# Altium footprint library cool_library.PcbLib: 1182 footprints (part 37 of 75)
Each footprint in its own frame and in the unit in brackets; x right, y up, seen from the top. Pads: shape width x height; smd on the part's side, far side on the other; paste and mask are expansions set on the pad; w line width, h text height; cw(c..) or ccw(c..) is an arc to the next point about the centre after c.
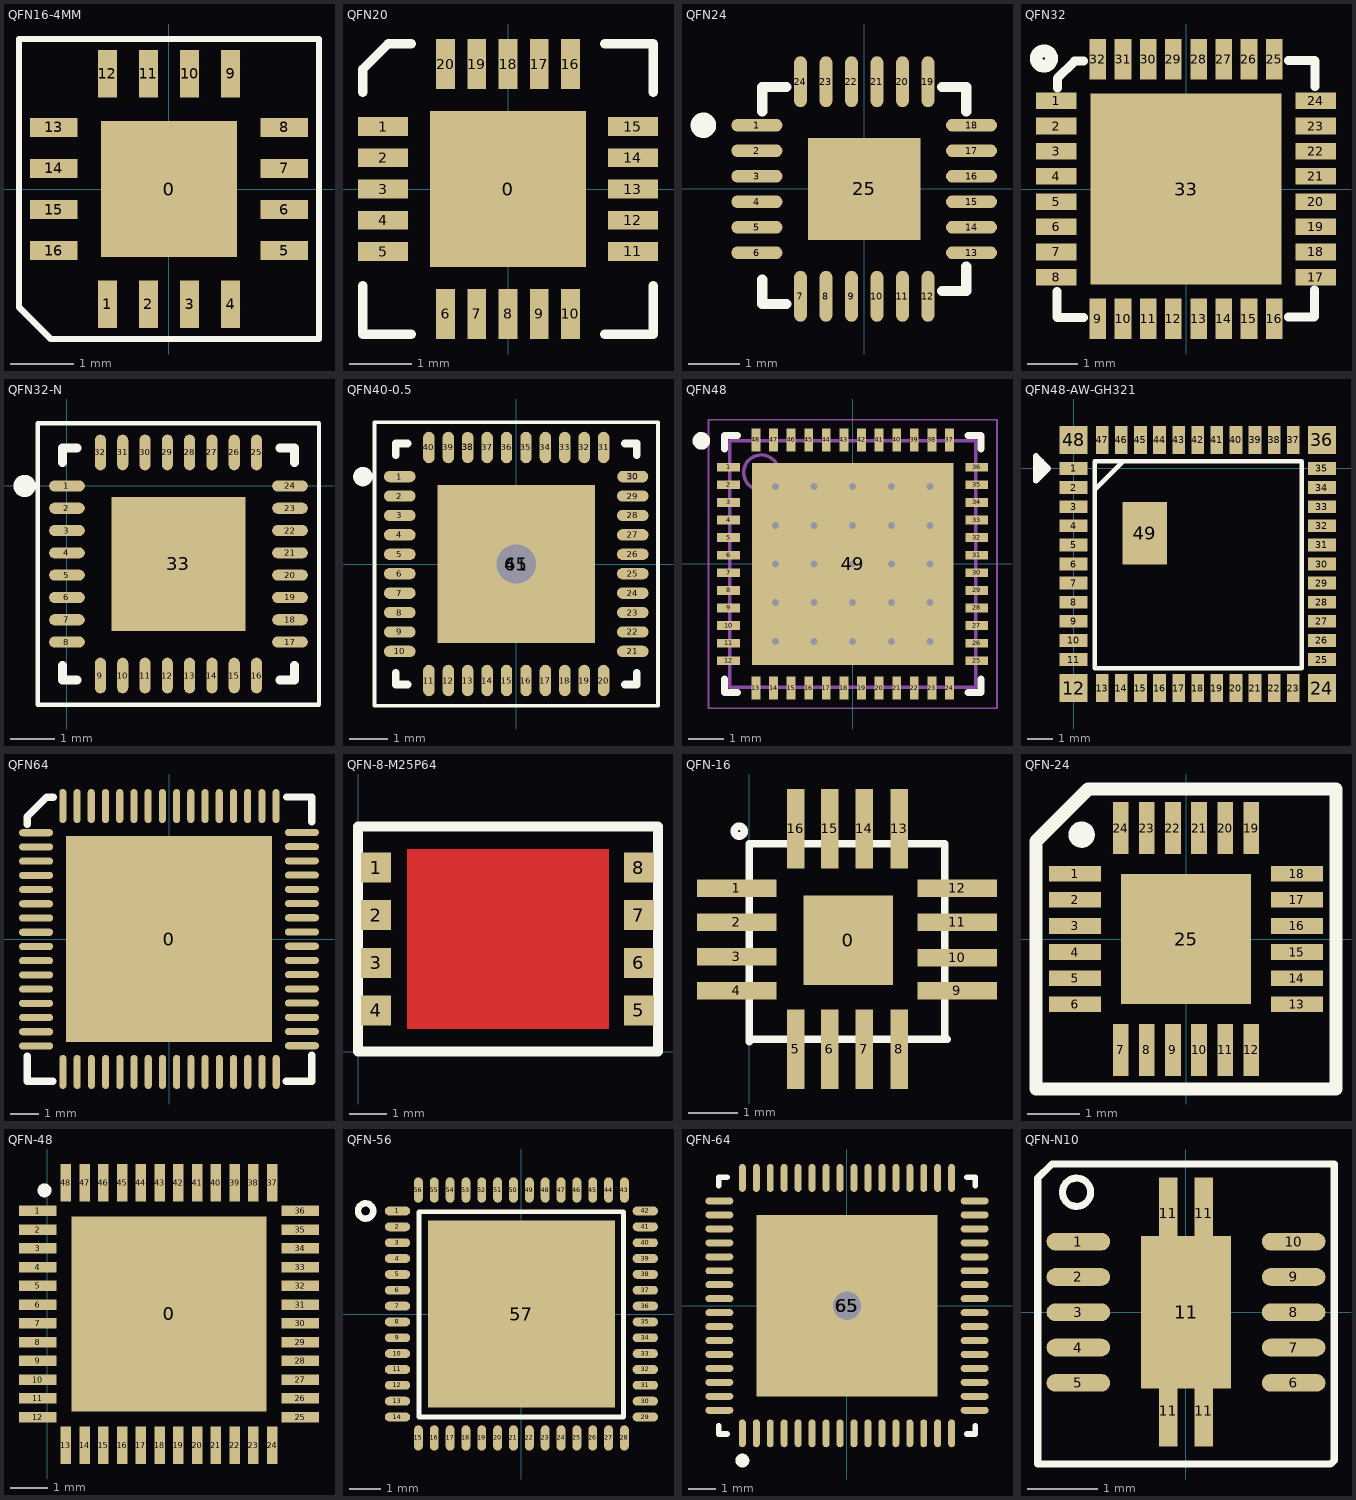
[diagram p36: the footprints below, top view; thin cyan lines are the x and y axes]

## QFN16-4MM [mm] "LNA"
height 5.33
pads (17):
  rect 2.15x2.15 smd: 0(0,0)
  rect 0.3x0.75 smd: 1(-0.975,-1.825) 2(-0.325,-1.825) 3(0.325,-1.825) 4(0.975,-1.825) 9(0.975,1.825) 10(0.325,1.825) 11(-0.325,1.825) 12(-0.975,1.825)
  rect 0.75x0.3 smd: 5(1.825,-0.975) 6(1.825,-0.325) 7(1.825,0.325) 8(1.825,0.975) 13(-1.825,0.975) 14(-1.825,0.325) 15(-1.825,-0.325) 16(-1.825,-0.975)
Top Overlay:
  lines w0.1: -1.025,2.375 2.375,2.375 2.375,-2.375 -1.525,-2.375 -1.875,-2.375 -2.375,-1.875 -2.375,-1.425 -2.375,2.375 -0.4,2.375
3D body: height 0.85, standoff 0, extent -2.001,-1.981 2.001,2.021

## QFN20 [mm]
pads (21):
  rect 2.5x2.5 smd: 0(0,0)
  rect 0.8x0.3 smd: 1(-2,1) 2(-2,0.5) 3(-2,0) 4(-2,-0.5) 5(-2,-1) 11(2,-1) 12(2,-0.5) 13(2,0) 14(2,0.5) 15(2,1)
  rect 0.3x0.8 smd: 6(-1,-2) 7(-0.5,-2) 8(0,-2) 9(0.5,-2) 10(1,-2) 16(1,2) 17(0.5,2) 18(0,2) 19(-0.5,2) 20(-1,2)
Top Overlay:
  lines w0.15: -2.325,-1.55 -2.325,-2.325 -1.55,-2.325 ; -2.325,1.55 -2.325,1.917 -1.917,2.325 -1.55,2.325 ; 1.55,-2.325 2.325,-2.325 2.325,-1.55 ; 1.55,2.325 2.325,2.325 2.325,1.55
3D body: height 0.62, standoff -0.08, extent -1.501,-1.5 1.499,1.5

## QFN24 [mm]
pads (25):
  oval 1x0.25 smd: 1(-2.104,1.25) 2(-2.104,0.75) 3(-2.104,0.25) 4(-2.104,-0.25) 5(-2.104,-0.75) 6(-2.104,-1.25) 13(2.104,-1.25) 14(2.104,-0.75) 15(2.104,-0.25) 16(2.104,0.25) 17(2.104,0.75) 18(2.104,1.25)
  oval 0.25x1 smd: 7(-1.25,-2.104) 8(-0.75,-2.104) 9(-0.25,-2.104) 10(0.25,-2.104) 11(0.75,-2.104) 12(1.25,-2.104) 19(1.25,2.104) 20(0.75,2.104) 21(0.25,2.104) 22(-0.25,2.104) 23(-0.75,2.104) 24(-1.25,2.104)
  rect 2.2x2 smd: 25(0,0)
Top Overlay:
  circle w0.25: c-3.154,1.25 r0.125
  lines w0.2: -2,-1.779 -2,-2.254 -1.525,-2.254 ; -2,1.525 -2,2 -1.525,2 ; 1.525,-2 2,-2 2,-1.525 ; 1.525,2 2,2 2,1.525

## QFN32 [mil]
pads (33):
  rect 31.5x13 smd: 1(-101.5,68.92) 2(-101.5,49.23) 3(-101.5,29.54) 4(-101.5,9.85) 5(-101.5,-9.85) 6(-101.5,-29.54) 7(-101.5,-49.23) 8(-101.5,-68.92) 17(101.5,-68.92) 18(101.5,-49.23) 19(101.5,-29.54) 20(101.5,-9.85) 21(101.5,9.85) 22(101.5,29.54) 23(101.5,49.23) 24(101.5,68.92)
  rect 13x31.5 smd: 9(-68.92,-101.5) 10(-49.23,-101.5) 11(-29.54,-101.5) 12(-9.85,-101.5) 13(9.85,-101.5) 14(29.54,-101.5) 15(49.23,-101.5) 16(68.92,-101.5) 25(68.92,101.5) 26(49.23,101.5) 27(29.54,101.5) 28(9.85,101.5) 29(-9.85,101.5) 30(-29.54,101.5) 31(-49.23,101.5) 32(-68.92,101.5)
  rect 149.61x149.61 smd: 33(0,0)
Top Overlay:
  circle w10: c-111,102 r6
  lines w7: -101,-80 -101,-100 -100.5,-100.5 -80,-100.5 ; -100.5,79 -100.5,86.5 -87,100 -80,100 ; 80,-100 100,-100 100.5,-99.5 100.5,-79 ; 80,100.5 100.5,100.5 101,100 101,80
3D body: height 31.5, standoff 0, extent -98.2,-98.81 99.44,98.82

## QFN32-N [mm]
pads (33):
  oval 0.8x0.25 smd: 1(0,0) 2(0,-0.5) 3(0,-1) 4(0,-1.5) 5(0,-2) 6(0,-2.5) 7(0,-3) 8(0,-3.5) 17(5,-3.5) 18(5,-3) 19(5,-2.5) 20(5,-2) 21(5,-1.5) 22(5,-1) 23(5,-0.5) 24(5,0)
  oval 0.25x0.8 smd: 9(0.75,-4.25) 10(1.25,-4.25) 11(1.75,-4.25) 12(2.25,-4.25) 13(2.75,-4.25) 14(3.25,-4.25) 15(3.75,-4.25) 16(4.25,-4.25) 25(4.25,0.75) 26(3.75,0.75) 27(3.25,0.75) 28(2.75,0.75) 29(2.25,0.75) 30(1.75,0.75) 31(1.25,0.75) 32(0.75,0.75)
  rect 3x3 smd: 33(2.5,-1.75)
Top Overlay:
  circle w0.25: c-0.95,0 r0.125
  lines w0.1: -0.65,-4.9 5.65,-4.9 5.65,1.4 -0.65,1.4 -0.65,-4.9
  lines w0.2: -0.1,-4.025 -0.1,-4.35 0.225,-4.35 ; -0.1,0.525 -0.1,0.85 0.225,0.85 ; 4.775,-4.35 5.1,-4.35 5.1,-4.025 ; 4.775,0.85 5.1,0.85 5.1,0.525
Top Solder:
  rectangle: 1.016,-1.524 2.286,-0.254
  rectangle: 2.718,-1.524 3.988,-0.254
  rectangle: 1.016,-3.251 2.286,-1.981
  rectangle: 2.718,-3.251 3.988,-1.981

## QFN40-0.5 [mm]
pads (42):
  oval 0.813x0.292 smd: 1(-3,2.25) 2(-3,1.75) 3(-3,1.25) 4(-3,0.75) 5(-3,0.25) 6(-3,-0.25) 7(-3,-0.75) 8(-3,-1.25) 9(-3,-1.75) 10(-3,-2.25) 21(3,-2.25) 22(3,-1.75) 23(3,-1.25) 24(3,-0.75) 25(3,-0.25) 26(3,0.25) 27(3,0.75) 28(3,1.25) 29(3,1.75)
  oval 0.292x0.813 smd: 11(-2.25,-3) 12(-1.75,-3) 13(-1.25,-3) 14(-0.75,-3) 15(-0.25,-3) 16(0.25,-3) 17(0.75,-3) 18(1.25,-3) 19(1.75,-3) 20(2.25,-3) 31(2.25,3) 32(1.75,3) 33(1.25,3) 34(0.75,3) 35(0.25,3) 36(-0.25,3) 37(-0.75,3) 39(-1.75,3) 40(-2.25,3)
  oval 0.8x0.3 smd: 30(3,2.25)
  oval 0.3x0.8 smd: 38(-1.25,3)
  rect 4.064x4.064 smd: 41(0,0)
  oct 1.524x1.524 hole 1.016: 65(0,0)
Top Overlay:
  circle w0.25: c-3.95,2.25 r0.125
  lines w0.1: -3.65,-3.65 3.65,-3.65 3.65,3.65 -3.65,3.65 -3.65,-3.65
  lines w0.2: -3.1,-2.8 -3.1,-3.1 -2.8,-3.1 ; -3.1,2.8 -3.1,3.1 -2.8,3.1 ; 2.8,-3.1 3.1,-3.1 3.1,-2.8 ; 2.8,3.1 3.1,3.1 3.1,2.8
Top Solder:
  rectangle: -2.032,0.711 -0.711,2.032
  region: -0.711,-2.032 -0.711,-0.711 -2.032,-0.711 -2.032,-2.032
  region: 2.032,-0.711 0.711,-0.711 0.711,-2.032 2.032,-2.032
  region: 0.711,2.032 0.711,0.711 2.032,0.711 2.032,2.032
  rectangle: -0.508,1.016 0.508,2.032
  region: -1.016,-0.508 -1.016,0.508 -2.032,0.508 -2.032,-0.508
  region: 0.508,-1.016 -0.508,-1.016 -0.508,-2.032 0.508,-2.032
  region: 1.016,0.508 1.016,-0.508 2.032,-0.508 2.032,0.508

## QFN48 [mm] "QFN, 48-Leads, Body 7.00x7.00mm, Pitch 0.50mm, Thermal Pad 5.73x5.73mm, IPC Medium Density"
height 1
pads (49):
  rect 0.65x0.25 smd: 1(-3.525,2.75) 2(-3.525,2.25) 3(-3.525,1.75) 4(-3.525,1.25) 5(-3.525,0.75) 6(-3.525,0.25) 7(-3.525,-0.25) 8(-3.525,-0.75) 9(-3.525,-1.25) 10(-3.525,-1.75) 11(-3.525,-2.25) 12(-3.525,-2.75) 25(3.525,-2.75) 26(3.525,-2.25) 27(3.525,-1.75) 28(3.525,-1.25) 29(3.525,-0.75) 30(3.525,-0.25) 31(3.525,0.25) 32(3.525,0.75) 33(3.525,1.25) 34(3.525,1.75) 35(3.525,2.25) 36(3.525,2.75)
  rect 0.25x0.65 smd: 13(-2.75,-3.525) 14(-2.25,-3.525) 15(-1.75,-3.525) 16(-1.25,-3.525) 17(-0.75,-3.525) 18(-0.25,-3.525) 19(0.25,-3.525) 20(0.75,-3.525) 21(1.25,-3.525) 22(1.75,-3.525) 23(2.25,-3.525) 24(2.75,-3.525) 37(2.75,3.525) 38(2.25,3.525) 39(1.75,3.525) 40(1.25,3.525) 41(0.75,3.525) 42(0.25,3.525) 43(-0.25,3.525) 44(-0.75,3.525) 45(-1.25,3.525) 46(-1.75,3.525) 47(-2.25,3.525) 48(-2.75,3.525)
  rect 5.73x5.73 smd: 49(0,0)
via -2.2,2.2 diameter 0.5 hole 0.2
via -1.1,2.2 diameter 0.5 hole 0.2
via 0,2.2 diameter 0.5 hole 0.2
via 1.1,2.2 diameter 0.5 hole 0.2
via 2.2,2.2 diameter 0.5 hole 0.2
via -2.2,1.1 diameter 0.5 hole 0.2
via -1.1,1.1 diameter 0.5 hole 0.2
via 0,1.1 diameter 0.5 hole 0.2
via 1.1,1.1 diameter 0.5 hole 0.2
via 2.2,1.1 diameter 0.5 hole 0.2
via -2.2,0 diameter 0.5 hole 0.2
via -1.1,0 diameter 0.5 hole 0.2
via 0,0 diameter 0.5 hole 0.2
via 1.1,0 diameter 0.5 hole 0.2
via 2.2,0 diameter 0.5 hole 0.2
via -2.2,-1.1 diameter 0.5 hole 0.2
via -1.1,-1.1 diameter 0.5 hole 0.2
via 0,-1.1 diameter 0.5 hole 0.2
via 1.1,-1.1 diameter 0.5 hole 0.2
via 2.2,-1.1 diameter 0.5 hole 0.2
via -2.2,-2.2 diameter 0.5 hole 0.2
via -1.1,-2.2 diameter 0.5 hole 0.2
via 0,-2.2 diameter 0.5 hole 0.2
via 1.1,-2.2 diameter 0.5 hole 0.2
via 2.2,-2.2 diameter 0.5 hole 0.2
Top Overlay:
  circle w0.25: c-4.3,3.5 r0.125
  lines w0.2: -3.65,-3.275 -3.65,-3.65 -3.275,-3.65 ; -3.65,3.275 -3.65,3.65 -3.275,3.65 ; 3.275,-3.65 3.65,-3.65 3.65,-3.275 ; 3.275,3.65 3.65,3.65 3.65,3.275
Mechanical 13:
  circle w0.1: c-2.6,2.6 r0.5
  lines w0.1: -3.5,-3.5 -3.5,3.5 3.5,3.5 3.5,-3.5 -3.5,-3.5
Mechanical 15:
  lines w0.05: -4.1,-4.1 -4.1,4.1 4.1,4.1 4.1,-4.1 -4.1,-4.1
  lines w0.1: -0.5,0 0.5,0 ; 0,-0.5 0,0.5
3D body: height 1, standoff 0.08, extent -3.5,-3.556 3.5,3.444

## QFN48-AW-GH321 [mm]
height 1.016
pads (49):
  rect 1.1x0.5 smd: 1(0,0) 2(0,-0.75) 3(0,-1.5) 4(0,-2.25) 5(0,-3) 6(0,-3.75) 7(0,-4.5) 8(0,-5.25) 9(0,-6) 10(0,-6.75) 11(0,-7.5) 25(9.75,-7.5) 26(9.75,-6.75) 27(9.75,-6) 28(9.75,-5.25) 29(9.75,-4.5) 30(9.75,-3.75) 31(9.75,-3) 32(9.75,-2.25) 33(9.75,-1.5) 34(9.75,-0.75) 35(9.75,0)
  rect 1.1x1.1 smd: 12(0,-8.625) 24(9.75,-8.625) 36(9.75,1.125) 48(0,1.125)
  rect 0.5x1.1 smd: 13(1.125,-8.625) 14(1.875,-8.625) 15(2.625,-8.625) 16(3.375,-8.625) 17(4.125,-8.625) 18(4.875,-8.625) 19(5.625,-8.625) 20(6.375,-8.625) 21(7.125,-8.625) 22(7.875,-8.625) 23(8.625,-8.625) 37(8.625,1.125) 38(7.875,1.125) 39(7.125,1.125) 40(6.375,1.125) 41(5.625,1.125) 42(4.875,1.125) 43(4.125,1.125) 44(3.375,1.125) 45(2.625,1.125) 46(1.875,1.125) 47(1.125,1.125)
  rect 1.75x2.47 smd: 49(2.797,-2.544)
Top Overlay:
  lines w0.178: -0.179,-8.55 0.075,-8.55 ; -0.179,1.05 0.074,1.05 ; 0.075,-8.804 0.075,-8.551 ; 0.075,1.05 0.075,1.304 ; 0.837,-0.831 1.956,0.288 ; 9.675,-8.804 9.675,-8.55 ; 9.675,1.051 9.929,1.051 ; 9.675,1.052 9.675,1.305 ; 9.676,-8.55 9.929,-8.55 ; 0.837,-7.84 0.837,0.288 8.965,0.288 8.965,-7.84 0.837,-7.84
  lines w0.229: -1.258,-0.215 -1.258,0.268 ; -1.473,-0.483 -0.991,0 -1.473,0.483 -1.473,-0.483

## QFN64 [mm]
pads (65):
  rect 7.25x7.25 smd: 0(0,-0.001)
  oval 1.2x0.25 smd: 1(-4.674,3.738) 2(-4.674,3.238) 3(-4.674,2.738) 4(-4.674,2.238) 5(-4.674,1.738) 6(-4.674,1.238) 7(-4.674,0.738) 8(-4.674,0.238) 9(-4.674,-0.262) 10(-4.674,-0.762) 11(-4.674,-1.262) 12(-4.674,-1.762) 13(-4.674,-2.262) 14(-4.674,-2.762) 15(-4.674,-3.262) 16(-4.674,-3.762) 33(4.674,-3.754) 34(4.674,-3.254) 35(4.674,-2.754) 36(4.674,-2.254) 37(4.674,-1.754) 38(4.674,-1.254) 39(4.674,-0.754) 40(4.674,-0.254) 41(4.674,0.246) 42(4.674,0.746) 43(4.674,1.246) 44(4.674,1.746) 45(4.674,2.246) 46(4.674,2.746) 47(4.674,3.246) 48(4.674,3.746)
  oval 0.25x1.2 smd: 17(-3.73,-4.675) 18(-3.23,-4.675) 19(-2.73,-4.675) 20(-2.23,-4.675) 21(-1.73,-4.675) 22(-1.23,-4.675) 23(-0.73,-4.675) 24(-0.23,-4.675) 25(0.27,-4.675) 26(0.77,-4.675) 27(1.27,-4.675) 28(1.77,-4.675) 29(2.27,-4.675) 30(2.77,-4.675) 31(3.27,-4.675) 32(3.77,-4.675) 49(3.767,4.675) 50(3.267,4.675) 51(2.767,4.675) 52(2.267,4.675) 53(1.767,4.675) 54(1.267,4.675) 55(0.767,4.675) 56(0.267,4.675) 57(-0.233,4.675) 58(-0.733,4.675) 59(-1.233,4.675) 60(-1.733,4.675) 61(-2.233,4.675) 62(-2.733,4.675) 63(-3.233,4.675) 64(-3.733,4.675)
Top Overlay:
  lines w0.254: -4.983,-4.116 -4.983,-5.004 -4.089,-5.004 ; -4.983,4.032 -4.983,4.312 -4.31,4.985 -4.064,4.985 ; 4.115,-5.004 5.017,-5.004 5.017,-4.091 ; 4.14,4.995 5.017,4.996 5.017,4.113
3D body: height 0.9, standoff 0, extent -4.52,-4.521 4.52,4.519

## QFN-8-M25P64 [mm]
pads (8):
  rect 0.8x0.8 smd: 1(0.484,4.905) 2(0.484,3.635) 3(0.484,2.365) 4(0.484,1.095) 5(7.493,1.095) 6(7.493,2.365) 7(7.493,3.635) 8(7.493,4.905)
Top Layer:
  rectangle: 1.3,0.6 6.7,5.4
Top Overlay:
  lines w0.254: 0,0 8,0 8,6 0,6 0,0

## QFN-16 [mm]
pads (17):
  rect 1.8x1.8 smd: 0(2,18.35)
  rect 1.6x0.35 smd: 1(-0.25,19.4) 2(-0.25,18.71) 3(-0.25,18.02) 4(-0.25,17.33) 9(4.2,17.33) 10(4.2,18) 11(4.2,18.71) 12(4.2,19.4)
  rect 0.35x1.6 smd: 5(0.94,16.15) 6(1.63,16.15) 7(2.32,16.15) 8(3.03,16.15) 13(3.03,20.6) 14(2.32,20.6) 15(1.63,20.6) 16(0.94,20.6)
Top Overlay:
  circle w0.152: c-0.2,20.55 r0.1
  lines w0.152: 0,16.3 0.05,16.35 4,16.35 3.95,16.4 3.95,20.3 0,20.3 0,16.3

## QFN-24 [mm]
pads (25):
  rect 1x0.3 smd: 1(-2.125,1.25) 2(-2.125,0.75) 3(-2.125,0.25) 4(-2.125,-0.25) 5(-2.125,-0.75) 6(-2.125,-1.25) 13(2.125,-1.25) 14(2.125,-0.75) 15(2.125,-0.25) 16(2.125,0.25) 17(2.125,0.75) 18(2.125,1.25)
  rect 0.3x1 smd: 7(-1.25,-2.125) 8(-0.75,-2.125) 9(-0.25,-2.125) 10(0.25,-2.125) 11(0.75,-2.125) 12(1.25,-2.125) 19(1.25,2.125) 20(0.75,2.125) 21(0.25,2.125) 22(-0.25,2.125) 23(-0.75,2.125) 24(-1.25,2.125)
  rect 2.5x2.5 smd: 25(0,0)
Top Overlay:
  circle w0.254: c-2,2 r0.125
  lines w0.254: -2.875,-2.875 2.875,-2.875 2.875,2.875 -1.25,2.875 -1.875,2.875 -2.875,1.875 -2.875,1.25 -2.875,-2.875
3D body: height 0.9, standoff 0, extent -2.002,-2.002 2.002,2.002

## QFN-48 [mm]
pads (49):
  rect 5.2x5.2 smd: 0(3.25,-8.25)
  rect 1x0.28 smd: 1(-0.25,-5.5) 2(-0.25,-6) 3(-0.25,-6.5) 4(-0.25,-7) 5(-0.25,-7.5) 6(-0.25,-8) 7(-0.25,-8.5) 8(-0.25,-9) 9(-0.25,-9.5) 10(-0.25,-10) 11(-0.25,-10.5) 12(-0.25,-11) 25(6.75,-11) 26(6.75,-10.5) 27(6.75,-10) 28(6.75,-9.5) 29(6.75,-9) 30(6.75,-8.5) 31(6.75,-8) 32(6.75,-7.5) 33(6.75,-7) 34(6.75,-6.5) 35(6.75,-6) 36(6.75,-5.5)
  rect 0.28x1 smd: 13(0.5,-11.75) 14(1,-11.75) 15(1.5,-11.75) 16(2,-11.75) 17(2.5,-11.75) 18(3,-11.75) 19(3.5,-11.75) 20(4,-11.75) 21(4.5,-11.75) 22(5,-11.75) 23(5.5,-11.75) 24(6,-11.75) 37(6,-4.75) 38(5.5,-4.75) 39(5,-4.75) 40(4.5,-4.75) 41(4,-4.75) 42(3.5,-4.75) 43(3,-4.75) 44(2.5,-4.75) 45(2,-4.75) 46(1.5,-4.75) 47(1,-4.75) 48(0.5,-4.75)
Top Overlay:
  circle w0.23: c-0.07,-4.953 r0.07

## QFN-56 [mm]
pads (57):
  oval 0.8x0.28 smd: 1(-3.91,3.25) 2(-3.91,2.75) 3(-3.91,2.25) 4(-3.91,1.75) 5(-3.91,1.25) 6(-3.91,0.75) 7(-3.91,0.25) 8(-3.91,-0.25) 9(-3.91,-0.75) 10(-3.91,-1.25) 11(-3.91,-1.75) 12(-3.91,-2.25) 13(-3.91,-2.75) 14(-3.91,-3.25) 29(3.91,-3.25) 30(3.91,-2.75) 31(3.91,-2.25) 32(3.91,-1.75) 33(3.91,-1.25) 34(3.91,-0.75) 35(3.91,-0.25) 36(3.91,0.25) 37(3.91,0.75) 38(3.91,1.25) 39(3.91,1.75) 40(3.91,2.25) 41(3.91,2.75) 42(3.91,3.25)
  oval 0.28x0.8 smd: 15(-3.25,-3.91) 16(-2.75,-3.91) 17(-2.25,-3.91) 18(-1.75,-3.91) 19(-1.25,-3.91) 20(-0.75,-3.91) 21(-0.25,-3.91) 22(0.25,-3.91) 23(0.75,-3.91) 24(1.25,-3.91) 25(1.75,-3.91) 26(2.25,-3.91) 27(2.75,-3.91) 28(3.25,-3.91) 43(3.25,3.91) 44(2.75,3.91) 45(2.25,3.91) 46(1.75,3.91) 47(1.25,3.91) 48(0.75,3.91) 49(0.25,3.91) 50(-0.25,3.91) 51(-0.75,3.91) 52(-1.25,3.91) 53(-1.75,3.91) 54(-2.25,3.91) 55(-2.75,3.91) 56(-3.25,3.91)
  rect 5.9x5.9 smd: 57(0,0)
Top Overlay:
  circle w0.203: c-4.915,3.251 r0.241
  lines w0.152: -3.226,-3.251 3.226,-3.251 3.226,3.226 -3.226,3.226 -3.226,-3.251

## QFN-64 [mm]
height 1.016
pads (66):
  oval 0.25x1 smd: 1(-3.75,-4.575) 2(-3.25,-4.575) 3(-2.75,-4.575) 4(-2.25,-4.575) 5(-1.75,-4.575) 6(-1.25,-4.575) 7(-0.75,-4.575) 8(-0.25,-4.575) 9(0.25,-4.575) 10(0.75,-4.575) 11(1.25,-4.575) 12(1.75,-4.575) 13(2.25,-4.575) 14(2.75,-4.575) 15(3.25,-4.575) 16(3.75,-4.575) 33(3.75,4.575) 34(3.25,4.575) 35(2.75,4.575) 36(2.25,4.575) 37(1.75,4.575) 38(1.25,4.575) 39(0.75,4.575) 40(0.25,4.575) 41(-0.25,4.575) 42(-0.75,4.575) 43(-1.25,4.575) 44(-1.75,4.575) 45(-2.25,4.575) 46(-2.75,4.575) 47(-3.25,4.575) 48(-3.75,4.575)
  oval 1x0.25 smd: 17(4.575,-3.75) 18(4.575,-3.25) 19(4.575,-2.75) 20(4.575,-2.25) 21(4.575,-1.75) 22(4.575,-1.25) 23(4.575,-0.75) 24(4.575,-0.25) 25(4.575,0.25) 26(4.575,0.75) 27(4.575,1.25) 28(4.575,1.75) 29(4.575,2.25) 30(4.575,2.75) 31(4.575,3.25) 32(4.575,3.75) 49(-4.575,3.75) 50(-4.575,3.25) 51(-4.575,2.75) 52(-4.575,2.25) 53(-4.575,1.75) 54(-4.575,1.25) 55(-4.575,0.75) 56(-4.575,0.25) 57(-4.575,-0.25) 58(-4.575,-0.75) 59(-4.575,-1.25) 60(-4.575,-1.75) 61(-4.575,-2.25) 62(-4.575,-2.75) 63(-4.575,-3.25) 64(-4.575,-3.75)
  oct 1.524x1.524 hole 1.016: 65(0,0)
  rect 6.5x6.5 smd: 65(0,0)
Top Overlay:
  circle w0.25: c-3.75,-5.55 r0.125
  lines w0.2: -4.6,-4.3 -4.6,-4.6 -4.3,-4.6 ; -4.6,4.3 -4.6,4.6 -4.3,4.6 ; 4.3,-4.6 4.6,-4.6 4.6,-4.3 ; 4.3,4.6 4.6,4.6 4.6,4.3
Top Solder:
  rectangle: -3.251,0.762 -0.762,3.251
  region: -0.762,-3.251 -0.762,-0.762 -3.251,-0.762 -3.251,-3.251
  region: 3.251,-0.762 0.762,-0.762 0.762,-3.251 3.251,-3.251
  region: 0.762,3.251 0.762,0.762 3.251,0.762 3.251,3.251
  rectangle: -0.381,1.016 0.381,3.251
  region: -1.016,-0.381 -1.016,0.381 -3.251,0.381 -3.251,-0.381
  region: 0.381,-1.016 -0.381,-1.016 -0.381,-3.251 0.381,-3.251
  region: 1.016,0.381 1.016,-0.381 3.251,-0.381 3.251,0.381

## QFN-N10 [mm]
height 1.2
pads (15):
  oval 0.9x0.25 smd: 1(-1.525,0.997) 2(-1.525,0.497) 3(-1.525,-0.003) 4(-1.525,-0.503) 5(-1.525,-1.003) 6(1.525,-1.003) 7(1.525,-0.503) 8(1.525,-0.003) 9(1.525,0.497) 10(1.525,0.997)
  rect 0.26x1.016 smd: 11(-0.25,-1.4) 11(-0.25,1.4) 11(0.25,-1.4) 11(0.25,1.4)
  rect 1.27x2.159 smd paste+0: 11(0,-0.003)
Top Overlay:
  circle w0.1: c-1.55,1.697 r0.2
  lines w0.1: -2.1,-2.153 -2.1,-1.103 -2.1,1.897 -1.9,2.097 0.65,2.097 2.1,2.097 2.1,-1.353 2.1,-2.103 2.05,-2.153 -2.1,-2.153